# Altium schematic symbol library jlcpcb_2025_04_inductors_extended_0402.schlib: 1396 symbols (part 5 of 8) (continued)
## MLG1005SR27JT000
designator L?  Inductance: 270nH
Inductor, 270nH, ±5%, 3.54Ω, 100mA, SMD 0402; Manufacturer: TDK; Manufacturer Part Number: MLG1005SR27JT000; Self-Resonant Frequency: 500MHz; Q Factor: 8@100MHz; Package Size: 0402; JLCPCB Basic Part: No; JLCPCB Part Number: C76784; Supplier 1: LCSC; Category: Inductors; Supplier Part Number 1: C76784; Tolerance: ±5%; Rated Current: 100mA; DC Resistance: 3.54Ω; RoHS: Yes; ComponentLink1Description: Datasheet; ComponentLink1URL: https://wmsc.lcsc.com/wmsc/upload/file/pdf/v2/lcsc/2304140030_TDK-MLG1005SR27JT000_C76784.pdf; ComponentLink2Description: JLCPCB Part URL; ComponentLink2URL: https://jlcpcb.com/partdetail/C76784; ComponentLink3Description: LCSC Part URL; ComponentLink3URL: https://lcsc.com/product-detail/Inductors-SMD_TDK-TDK-MLG1005SR27JT000_C76784.html
footprint IND-0402 (0402 (1005M) Inductor)
pins: 1, 2

## MLG1005SR33JT000
designator L?  Inductance: 330nH
Inductor, 330nH, ±5%, 5.21Ω, 50mA, SMD 0402; Manufacturer: TDK; Manufacturer Part Number: MLG1005SR33JT000; Self-Resonant Frequency: 400MHz; Q Factor: 6@50MHz; Package Size: 0402; JLCPCB Basic Part: No; JLCPCB Part Number: C76785; Supplier 1: LCSC; Category: Inductors; Supplier Part Number 1: C76785; Tolerance: ±5%; Rated Current: 50mA; DC Resistance: 5.21Ω; RoHS: Yes; ComponentLink1Description: Datasheet; ComponentLink1URL: https://wmsc.lcsc.com/wmsc/upload/file/pdf/v2/lcsc/2304140030_TDK-MLG1005SR33JT000_C76785.pdf; ComponentLink2Description: JLCPCB Part URL; ComponentLink2URL: https://jlcpcb.com/partdetail/C76785; ComponentLink3Description: LCSC Part URL; ComponentLink3URL: https://lcsc.com/product-detail/Inductors-SMD_TDK-TDK-MLG1005SR33JT000_C76785.html
footprint IND-0402 (0402 (1005M) Inductor)
pins: 1, 2

## MLG1005SR39HT000
designator L?  Inductance: 390nH
Inductor, 390nH, ±3%, 5.97Ω, 50mA, SMD 0402; Manufacturer: TDK; Manufacturer Part Number: MLG1005SR39HT000; Self-Resonant Frequency: 400MHz; Q Factor: 6@50MHz; Package Size: 0402; JLCPCB Basic Part: No; JLCPCB Part Number: C360714; Supplier 1: LCSC; Category: Inductors; Supplier Part Number 1: C360714; Tolerance: ±3%; Rated Current: 50mA; DC Resistance: 5.97Ω; RoHS: Yes; ComponentLink1Description: Datasheet; ComponentLink1URL: https://wmsc.lcsc.com/wmsc/upload/file/pdf/v2/lcsc/1912111437_TDK-MLG1005SR39HT000_C360714.pdf; ComponentLink2Description: JLCPCB Part URL; ComponentLink2URL: https://jlcpcb.com/partdetail/C360714; ComponentLink3Description: LCSC Part URL; ComponentLink3URL: https://lcsc.com/product-detail/Inductors-SMD_TDK-TDK-MLG1005SR39HT000_C360714.html
footprint IND-0402 (0402 (1005M) Inductor)
pins: 1, 2

## MLG1005SR39JT000
designator L?  Inductance: 390nH
Inductor, 390nH, ±5%, 5.97Ω, 50mA, SMD 0402; Manufacturer: TDK; Manufacturer Part Number: MLG1005SR39JT000; Self-Resonant Frequency: 400MHz; Q Factor: 6@50MHz; Package Size: 0402; JLCPCB Basic Part: No; JLCPCB Part Number: C76786; Supplier 1: LCSC; Category: Inductors; Supplier Part Number 1: C76786; Tolerance: ±5%; Rated Current: 50mA; DC Resistance: 5.97Ω; RoHS: Yes; ComponentLink1Description: Datasheet; ComponentLink1URL: https://wmsc.lcsc.com/wmsc/upload/file/pdf/v2/lcsc/2304140030_TDK-MLG1005SR39JT000_C76786.pdf; ComponentLink2Description: JLCPCB Part URL; ComponentLink2URL: https://jlcpcb.com/partdetail/C76786; ComponentLink3Description: LCSC Part URL; ComponentLink3URL: https://lcsc.com/product-detail/Inductors-SMD_TDK-TDK-MLG1005SR39JT000_C76786.html
footprint IND-0402 (0402 (1005M) Inductor)
pins: 1, 2

## MLI1005F-R12KT
designator L?  Inductance: 0.12uH
Inductor, 0.12uH, ±10%, 0.8Ω, 25mA, SMD 0402; Manufacturer: Meled; Manufacturer Part Number: MLI1005F-R12KT; Self-Resonant Frequency: 165MHz; Q Factor: 10@25MHz; Package Size: 0402; JLCPCB Basic Part: No; JLCPCB Part Number: C2885830; Supplier 1: LCSC; Category: Inductors; Supplier Part Number 1: C2885830; Tolerance: ±10%; Rated Current: 25mA; DC Resistance: 0.8Ω; RoHS: Yes; ComponentLink1Description: Datasheet; ComponentLink1URL: https://wmsc.lcsc.com/wmsc/upload/file/pdf/v2/lcsc/2306021138_MetalLions-MLI1005F-R12KT_C2885830.pdf; ComponentLink2Description: JLCPCB Part URL; ComponentLink2URL: https://jlcpcb.com/partdetail/C2885830; ComponentLink3Description: LCSC Part URL; ComponentLink3URL: https://lcsc.com/product-detail/Inductors-SMD_MetalLions-MetalLions-MLI1005F-R12KT_C2885830.html
footprint IND-0402 (0402 (1005M) Inductor)
pins: 1, 2

## MLI1005F-R22KT
designator L?  Inductance: 0.22uH
Inductor, 0.22uH, ±10%, 1.2Ω, 25mA, SMD 0402; Manufacturer: Meled; Manufacturer Part Number: MLI1005F-R22KT; Self-Resonant Frequency: 110MHz; Q Factor: 10@25MHz; Package Size: 0402; JLCPCB Basic Part: No; JLCPCB Part Number: C2885833; Supplier 1: LCSC; Category: Inductors; Supplier Part Number 1: C2885833; Tolerance: ±10%; Rated Current: 25mA; DC Resistance: 1.2Ω; RoHS: Yes; ComponentLink1Description: Datasheet; ComponentLink1URL: https://wmsc.lcsc.com/wmsc/upload/file/pdf/v2/lcsc/2306021138_MetalLions-MLI1005F-R22KT_C2885833.pdf; ComponentLink2Description: JLCPCB Part URL; ComponentLink2URL: https://jlcpcb.com/partdetail/C2885833; ComponentLink3Description: LCSC Part URL; ComponentLink3URL: https://lcsc.com/product-detail/Inductors-SMD_MetalLions-MetalLions-MLI1005F-R22KT_C2885833.html
footprint IND-0402 (0402 (1005M) Inductor)
pins: 1, 2

## MLI1005F-R47KT
designator L?  Inductance: 470nH
Inductor, 470nH, ±10%, 0.7Ω, 15mA, SMD 0402; Manufacturer: Meled; Manufacturer Part Number: MLI1005F-R47KT; Self-Resonant Frequency: 80MHz; Q Factor: 20@10MHz; Package Size: 0402; JLCPCB Basic Part: No; JLCPCB Part Number: C2885835; Supplier 1: LCSC; Category: Inductors; Supplier Part Number 1: C2885835; Tolerance: ±10%; Rated Current: 15mA; DC Resistance: 0.7Ω; RoHS: Yes; ComponentLink1Description: Datasheet; ComponentLink1URL: https://wmsc.lcsc.com/wmsc/upload/file/pdf/v2/lcsc/2306021138_MetalLions-MLI1005F-R47KT_C2885835.pdf; ComponentLink2Description: JLCPCB Part URL; ComponentLink2URL: https://jlcpcb.com/partdetail/C2885835; ComponentLink3Description: LCSC Part URL; ComponentLink3URL: https://lcsc.com/product-detail/Inductors-SMD_MetalLions-MetalLions-MLI1005F-R47KT_C2885835.html
footprint IND-0402 (0402 (1005M) Inductor)
pins: 1, 2

## MLJ1005WR10JT000
designator L?  Inductance: 100nH
Inductor, 100nH, ±5%, 300mΩ, 500mA, SMD 0402; Manufacturer: TDK; Manufacturer Part Number: MLJ1005WR10JT000; Self-Resonant Frequency: 550MHz; Q Factor: 15@25MHz; Package Size: 0402; JLCPCB Basic Part: No; JLCPCB Part Number: C380011; Supplier 1: LCSC; Category: Inductors; Supplier Part Number 1: C380011; Tolerance: ±5%; Rated Current: 500mA; Saturation Current: 500mA; DC Resistance: 300mΩ; RoHS: Yes; ComponentLink1Description: Datasheet; ComponentLink1URL: https://wmsc.lcsc.com/wmsc/upload/file/pdf/v2/lcsc/2304140030_TDK-MLJ1005WR10JT000_C380011.pdf; ComponentLink2Description: JLCPCB Part URL; ComponentLink2URL: https://jlcpcb.com/partdetail/C380011; ComponentLink3Description: LCSC Part URL; ComponentLink3URL: https://lcsc.com/product-detail/Inductors-SMD_TDK-TDK-MLJ1005WR10JT000_C380011.html
footprint IND-0402 (0402 (1005M) Inductor)
pins: 1, 2

## MLJ1005WR16JT000
designator L?  Inductance: 160nH
Inductor, 160nH, ±5%, 520mΩ, 400mA, SMD 0402; Manufacturer: TDK; Manufacturer Part Number: MLJ1005WR16JT000; Saturation Current: 450mA; Self-Resonant Frequency: 600MHz; Q Factor: 15@25MHz; Package Size: 0402; JLCPCB Basic Part: No; JLCPCB Part Number: C413908; Supplier 1: LCSC; Category: Inductors; Supplier Part Number 1: C413908; Tolerance: ±5%; Rated Current: 400mA; DC Resistance: 520mΩ; RoHS: Yes; ComponentLink1Description: Datasheet; ComponentLink1URL: https://wmsc.lcsc.com/wmsc/upload/file/pdf/v2/lcsc/1912111437_TDK-MLJ1005WR16JT000_C413908.pdf; ComponentLink2Description: JLCPCB Part URL; ComponentLink2URL: https://jlcpcb.com/partdetail/C413908; ComponentLink3Description: LCSC Part URL; ComponentLink3URL: https://lcsc.com/product-detail/Inductors-SMD_TDK-TDK-MLJ1005WR16JT000_C413908.html
footprint IND-0402 (0402 (1005M) Inductor)
pins: 1, 2

## MLK1005S1N2ST000
designator L?  Inductance: 1.2nH
Inductor, 1.2nH, 50mΩ, 500mA, SMD 0402; Manufacturer: TDK; Manufacturer Part Number: MLK1005S1N2ST000; Self-Resonant Frequency: 11GHz; Q Factor: 5@100MHz; Package Size: 0402; JLCPCB Basic Part: No; JLCPCB Part Number: C275321; Supplier 1: LCSC; Category: Inductors; Supplier Part Number 1: C275321; Rated Current: 500mA; DC Resistance: 50mΩ; RoHS: Yes; ComponentLink1Description: Datasheet; ComponentLink1URL: https://wmsc.lcsc.com/wmsc/upload/file/pdf/v2/lcsc/2304140030_TDK-MLK1005S1N2ST000_C275321.pdf; ComponentLink2Description: JLCPCB Part URL; ComponentLink2URL: https://jlcpcb.com/partdetail/C275321; ComponentLink3Description: LCSC Part URL; ComponentLink3URL: https://lcsc.com/product-detail/Inductors-SMD_TDK-TDK-MLK1005S1N2ST000_C275321.html
footprint IND-0402 (0402 (1005M) Inductor)
pins: 1, 2

## MLK1005S1N5ST000
designator L?  Inductance: 1.5nH
Inductor, 1.5nH, 60mΩ, 500mA, SMD 0402; Manufacturer: TDK; Manufacturer Part Number: MLK1005S1N5ST000; Self-Resonant Frequency: 9.5GHz; Q Factor: 6@100MHz; Package Size: 0402; JLCPCB Basic Part: No; JLCPCB Part Number: C114769; Supplier 1: LCSC; Category: Inductors; Supplier Part Number 1: C114769; Rated Current: 500mA; DC Resistance: 60mΩ; RoHS: Yes; ComponentLink1Description: Datasheet; ComponentLink1URL: https://wmsc.lcsc.com/wmsc/upload/file/pdf/v2/lcsc/2304140030_TDK-MLK1005S1N5ST000_C114769.pdf; ComponentLink2Description: JLCPCB Part URL; ComponentLink2URL: https://jlcpcb.com/partdetail/C114769; ComponentLink3Description: LCSC Part URL; ComponentLink3URL: https://lcsc.com/product-detail/Inductors-SMD_TDK-TDK-MLK1005S1N5ST000_C114769.html
footprint IND-0402 (0402 (1005M) Inductor)
pins: 1, 2

## MLK1005S1N8ST000
designator L?  Inductance: 1.8nH
Inductor, 1.8nH, 70mΩ, 500mA, SMD 0402; Manufacturer: TDK; Manufacturer Part Number: MLK1005S1N8ST000; Self-Resonant Frequency: 8.5GHz; Q Factor: 6@100MHz; Package Size: 0402; JLCPCB Basic Part: No; JLCPCB Part Number: C76789; Supplier 1: LCSC; Category: Inductors; Supplier Part Number 1: C76789; Rated Current: 500mA; DC Resistance: 70mΩ; RoHS: Yes; ComponentLink1Description: Datasheet; ComponentLink1URL: https://wmsc.lcsc.com/wmsc/upload/file/pdf/v2/lcsc/2304140030_TDK-MLK1005S1N8ST000_C76789.pdf; ComponentLink2Description: JLCPCB Part URL; ComponentLink2URL: https://jlcpcb.com/partdetail/C76789; ComponentLink3Description: LCSC Part URL; ComponentLink3URL: https://lcsc.com/product-detail/Inductors-SMD_TDK-TDK-MLK1005S1N8ST000_C76789.html
footprint IND-0402 (0402 (1005M) Inductor)
pins: 1, 2

## MLK1005S2N2ST000
designator L?  Inductance: 2.2nH
Inductor, 2.2nH, 80mΩ, 500mA, SMD 0402; Manufacturer: TDK; Manufacturer Part Number: MLK1005S2N2ST000; Self-Resonant Frequency: 8GHz; Q Factor: 6@100MHz; Package Size: 0402; JLCPCB Basic Part: No; JLCPCB Part Number: C76790; Supplier 1: LCSC; Category: Inductors; Supplier Part Number 1: C76790; Rated Current: 500mA; DC Resistance: 80mΩ; RoHS: Yes; ComponentLink1Description: Datasheet; ComponentLink1URL: https://wmsc.lcsc.com/wmsc/upload/file/pdf/v2/lcsc/1809051312_TDK-MLK1005S2N2ST000_C76790.pdf; ComponentLink2Description: JLCPCB Part URL; ComponentLink2URL: https://jlcpcb.com/partdetail/C76790; ComponentLink3Description: LCSC Part URL; ComponentLink3URL: https://lcsc.com/product-detail/Inductors-SMD_TDK-TDK-MLK1005S2N2ST000_C76790.html
footprint IND-0402 (0402 (1005M) Inductor)
pins: 1, 2

## MLK1005S2N7ST000
designator L?  Inductance: 2.7nH
Inductor, 2.7nH, 100mΩ, 500mA, SMD 0402; Manufacturer: TDK; Manufacturer Part Number: MLK1005S2N7ST000; Self-Resonant Frequency: 7.5GHz; Q Factor: 6@100MHz; Package Size: 0402; JLCPCB Basic Part: No; JLCPCB Part Number: C76791; Supplier 1: LCSC; Category: Inductors; Supplier Part Number 1: C76791; Rated Current: 500mA; DC Resistance: 100mΩ; RoHS: Yes; ComponentLink1Description: Datasheet; ComponentLink1URL: https://wmsc.lcsc.com/wmsc/upload/file/pdf/v2/lcsc/2304140030_TDK-MLK1005S2N7ST000_C76791.pdf; ComponentLink2Description: JLCPCB Part URL; ComponentLink2URL: https://jlcpcb.com/partdetail/C76791; ComponentLink3Description: LCSC Part URL; ComponentLink3URL: https://lcsc.com/product-detail/Inductors-SMD_TDK-TDK-MLK1005S2N7ST000_C76791.html
footprint IND-0402 (0402 (1005M) Inductor)
pins: 1, 2

## MLK1005S3N3ST000
designator L?  Inductance: 3.3nH
Inductor, 3.3nH, 110mΩ, 400mA, SMD 0402; Manufacturer: TDK; Manufacturer Part Number: MLK1005S3N3ST000; Self-Resonant Frequency: 8.3GHz; Q Factor: 7@100MHz; Package Size: 0402; JLCPCB Basic Part: No; JLCPCB Part Number: C107321; Supplier 1: LCSC; Category: Inductors; Supplier Part Number 1: C107321; Rated Current: 400mA; DC Resistance: 110mΩ; RoHS: Yes; ComponentLink1Description: Datasheet; ComponentLink1URL: https://wmsc.lcsc.com/wmsc/upload/file/pdf/v2/lcsc/1810162216_TDK-MLK1005S3N3ST000_C107321.pdf; ComponentLink2Description: JLCPCB Part URL; ComponentLink2URL: https://jlcpcb.com/partdetail/C107321; ComponentLink3Description: LCSC Part URL; ComponentLink3URL: https://lcsc.com/product-detail/Inductors-SMD_TDK-TDK-MLK1005S3N3ST000_C107321.html
footprint IND-0402 (0402 (1005M) Inductor)
pins: 1, 2

## MLK1005S3N9ST000
designator L?  Inductance: 3.9nH
Inductor, 3.9nH, 120mΩ, 400mA, SMD 0402; Manufacturer: TDK; Manufacturer Part Number: MLK1005S3N9ST000; Self-Resonant Frequency: 7.8GHz; Q Factor: 7@100MHz; Package Size: 0402; JLCPCB Basic Part: No; JLCPCB Part Number: C76792; Supplier 1: LCSC; Category: Inductors; Supplier Part Number 1: C76792; Rated Current: 400mA; DC Resistance: 120mΩ; RoHS: Yes; ComponentLink1Description: Datasheet; ComponentLink1URL: https://wmsc.lcsc.com/wmsc/upload/file/pdf/v2/lcsc/2304140030_TDK-MLK1005S3N9ST000_C76792.pdf; ComponentLink2Description: JLCPCB Part URL; ComponentLink2URL: https://jlcpcb.com/partdetail/C76792; ComponentLink3Description: LCSC Part URL; ComponentLink3URL: https://lcsc.com/product-detail/Inductors-SMD_TDK-TDK-MLK1005S3N9ST000_C76792.html
footprint IND-0402 (0402 (1005M) Inductor)
pins: 1, 2

## MLK1005S3N9STD25
designator L?  Inductance: 3.9nH
Inductor, 3.9nH, 250mΩ, 400mA, SMD 0402; Manufacturer: TDK; Manufacturer Part Number: MLK1005S3N9STD25; Q Factor: 7@100MHz; Package Size: 0402; JLCPCB Basic Part: No; JLCPCB Part Number: C524461; Supplier 1: LCSC; Category: Inductors; Supplier Part Number 1: C524461; Rated Current: 400mA; DC Resistance: 250mΩ; RoHS: Yes; ComponentLink1Description: Datasheet; ComponentLink1URL: https://wmsc.lcsc.com/wmsc/upload/file/pdf/v2/lcsc/2304140030_TDK-MLK1005S3N9STD25_C524461.pdf; ComponentLink2Description: JLCPCB Part URL; ComponentLink2URL: https://jlcpcb.com/partdetail/C524461; ComponentLink3Description: LCSC Part URL; ComponentLink3URL: https://lcsc.com/product-detail/Inductors-SMD_TDK-TDK-MLK1005S3N9STD25_C524461.html
footprint IND-0402 (0402 (1005M) Inductor)
pins: 1, 2

## MLK1005S4N3ST000
designator L?  Inductance: 4.3nH
Inductor, 4.3nH, 130mΩ, 400mA, SMD 0402; Manufacturer: TDK; Manufacturer Part Number: MLK1005S4N3ST000; Self-Resonant Frequency: 7.4GHz; Q Factor: 7@100MHz; Package Size: 0402; JLCPCB Basic Part: No; JLCPCB Part Number: C275326; Supplier 1: LCSC; Category: Inductors; Supplier Part Number 1: C275326; Rated Current: 400mA; DC Resistance: 130mΩ; RoHS: Yes; ComponentLink1Description: Datasheet; ComponentLink1URL: https://wmsc.lcsc.com/wmsc/upload/file/pdf/v2/lcsc/2304140030_TDK-MLK1005S4N3ST000_C275326.pdf; ComponentLink2Description: JLCPCB Part URL; ComponentLink2URL: https://jlcpcb.com/partdetail/C275326; ComponentLink3Description: LCSC Part URL; ComponentLink3URL: https://lcsc.com/product-detail/Inductors-SMD_TDK-TDK-MLK1005S4N3ST000_C275326.html
footprint IND-0402 (0402 (1005M) Inductor)
pins: 1, 2

## MLK1005S4N7ST000
designator L?  Inductance: 4.7nH
Inductor, 4.7nH, 130mΩ, 400mA, SMD 0402; Manufacturer: TDK; Manufacturer Part Number: MLK1005S4N7ST000; Self-Resonant Frequency: 6GHz; Q Factor: 7@100MHz; Package Size: 0402; JLCPCB Basic Part: No; JLCPCB Part Number: C136252; Supplier 1: LCSC; Category: Inductors; Supplier Part Number 1: C136252; Rated Current: 400mA; DC Resistance: 130mΩ; RoHS: Yes; ComponentLink1Description: Datasheet; ComponentLink1URL: https://wmsc.lcsc.com/wmsc/upload/file/pdf/v2/lcsc/2304140030_TDK-MLK1005S4N7ST000_C136252.pdf; ComponentLink2Description: JLCPCB Part URL; ComponentLink2URL: https://jlcpcb.com/partdetail/C136252; ComponentLink3Description: LCSC Part URL; ComponentLink3URL: https://lcsc.com/product-detail/Inductors-SMD_TDK-TDK-MLK1005S4N7ST000_C136252.html
footprint IND-0402 (0402 (1005M) Inductor)
pins: 1, 2

## MLK1005S5N6DT000
designator L?  Inductance: 5.6nH
Inductor, 5.6nH, 150mΩ, 400mA, SMD 0402; Manufacturer: TDK; Manufacturer Part Number: MLK1005S5N6DT000; Package Size: 0402; JLCPCB Basic Part: No; JLCPCB Part Number: C275328; Supplier 1: LCSC; Category: Inductors; Supplier Part Number 1: C275328; Rated Current: 400mA; DC Resistance: 150mΩ; RoHS: Yes; ComponentLink1Description: Datasheet; ComponentLink1URL: https://wmsc.lcsc.com/wmsc/upload/file/pdf/v2/lcsc/2007151106_TDK-MLK1005S5N6DT000_C275328.pdf; ComponentLink2Description: JLCPCB Part URL; ComponentLink2URL: https://jlcpcb.com/partdetail/C275328; ComponentLink3Description: LCSC Part URL; ComponentLink3URL: https://lcsc.com/product-detail/Inductors-SMD_TDK-TDK-MLK1005S5N6DT000_C275328.html
footprint IND-0402 (0402 (1005M) Inductor)
pins: 1, 2

## MLK1005S6N8DT000
designator L?  Inductance: 6.8nH
Inductor, 6.8nH, 350mΩ, 400mA, SMD 0402; Manufacturer: TDK; Manufacturer Part Number: MLK1005S6N8DT000; Self-Resonant Frequency: 100MHz; Q Factor: 7@100MHz; Package Size: 0402; JLCPCB Basic Part: No; JLCPCB Part Number: C275330; Supplier 1: LCSC; Category: Inductors; Supplier Part Number 1: C275330; Rated Current: 400mA; DC Resistance: 350mΩ; RoHS: Yes; ComponentLink1Description: Datasheet; ComponentLink1URL: https://wmsc.lcsc.com/wmsc/upload/file/pdf/v2/lcsc/2304140030_TDK-MLK1005S6N8DT000_C275330.pdf; ComponentLink2Description: JLCPCB Part URL; ComponentLink2URL: https://jlcpcb.com/partdetail/C275330; ComponentLink3Description: LCSC Part URL; ComponentLink3URL: https://lcsc.com/product-detail/Inductors-SMD_TDK-TDK-MLK1005S6N8DT000_C275330.html
footprint IND-0402 (0402 (1005M) Inductor)
pins: 1, 2

## MLK1005S8N2DT000
designator L?  Inductance: 8.2nH
Inductor, 8.2nH, SMD 0402; Manufacturer: TDK; Manufacturer Part Number: MLK1005S8N2DT000; Package Size: 0402; JLCPCB Basic Part: No; JLCPCB Part Number: C87541; Supplier 1: LCSC; Category: Inductors; Supplier Part Number 1: C87541; RoHS: Yes; ComponentLink1Description: Datasheet; ComponentLink1URL: https://wmsc.lcsc.com/wmsc/upload/file/pdf/v2/lcsc/2304140030_TDK-MLK1005S8N2DT000_C87541.pdf; ComponentLink2Description: JLCPCB Part URL; ComponentLink2URL: https://jlcpcb.com/partdetail/C87541; ComponentLink3Description: LCSC Part URL; ComponentLink3URL: https://lcsc.com/product-detail/Inductors-SMD_TDK-TDK-MLK1005S8N2DT000_C87541.html
footprint IND-0402 (0402 (1005M) Inductor)
pins: 1, 2

## MLK1005S8N2JT000
designator L?  Inductance: 8.2nH
Inductor, 8.2nH, ±5%, 210mΩ, 350mA, SMD 0402; Manufacturer: TDK; Manufacturer Part Number: MLK1005S8N2JT000; Self-Resonant Frequency: 5GHz; Q Factor: 7@100MHz; Package Size: 0402; JLCPCB Basic Part: No; JLCPCB Part Number: C87542; Supplier 1: LCSC; Category: Inductors; Supplier Part Number 1: C87542; Tolerance: ±5%; Rated Current: 350mA; DC Resistance: 210mΩ; RoHS: Yes; ComponentLink1Description: Datasheet; ComponentLink1URL: https://wmsc.lcsc.com/wmsc/upload/file/pdf/v2/lcsc/2304140030_TDK-MLK1005S8N2JT000_C87542.pdf; ComponentLink2Description: JLCPCB Part URL; ComponentLink2URL: https://jlcpcb.com/partdetail/C87542; ComponentLink3Description: LCSC Part URL; ComponentLink3URL: https://lcsc.com/product-detail/Inductors-SMD_TDK-TDK-MLK1005S8N2JT000_C87542.html
footprint IND-0402 (0402 (1005M) Inductor)
pins: 1, 2

## MLK1005S10NJT000
designator L?  Inductance: 10nH
Inductor, 10nH, ±5%, 230mΩ, 350mA, SMD 0402; Manufacturer: TDK; Manufacturer Part Number: MLK1005S10NJT000; Self-Resonant Frequency: 5.2GHz; Q Factor: 7@100MHz; Package Size: 0402; JLCPCB Basic Part: No; JLCPCB Part Number: C275317; Supplier 1: LCSC; Category: Inductors; Supplier Part Number 1: C275317; Tolerance: ±5%; Rated Current: 350mA; DC Resistance: 230mΩ; RoHS: Yes; ComponentLink1Description: Datasheet; ComponentLink1URL: https://wmsc.lcsc.com/wmsc/upload/file/pdf/v2/lcsc/2304140030_TDK-MLK1005S10NJT000_C275317.pdf; ComponentLink2Description: JLCPCB Part URL; ComponentLink2URL: https://jlcpcb.com/partdetail/C275317; ComponentLink3Description: LCSC Part URL; ComponentLink3URL: https://lcsc.com/product-detail/Inductors-SMD_TDK-TDK-MLK1005S10NJT000_C275317.html
footprint IND-0402 (0402 (1005M) Inductor)
pins: 1, 2

## MLK1005S12NHT000
designator L?  Inductance: 12nH
Inductor, 12nH, ±3%, SMD 0402; Manufacturer: TDK; Manufacturer Part Number: MLK1005S12NHT000; Package Size: 0402; JLCPCB Basic Part: No; JLCPCB Part Number: C275318; Supplier 1: LCSC; Category: Inductors; Supplier Part Number 1: C275318; Tolerance: ±3%; RoHS: Yes; ComponentLink1Description: Datasheet; ComponentLink1URL: https://wmsc.lcsc.com/wmsc/upload/file/pdf/v2/lcsc/2304140030_TDK-MLK1005S12NHT000_C275318.pdf; ComponentLink2Description: JLCPCB Part URL; ComponentLink2URL: https://jlcpcb.com/partdetail/C275318; ComponentLink3Description: LCSC Part URL; ComponentLink3URL: https://lcsc.com/product-detail/Inductors-SMD_TDK-TDK-MLK1005S12NHT000_C275318.html
footprint IND-0402 (0402 (1005M) Inductor)
pins: 1, 2

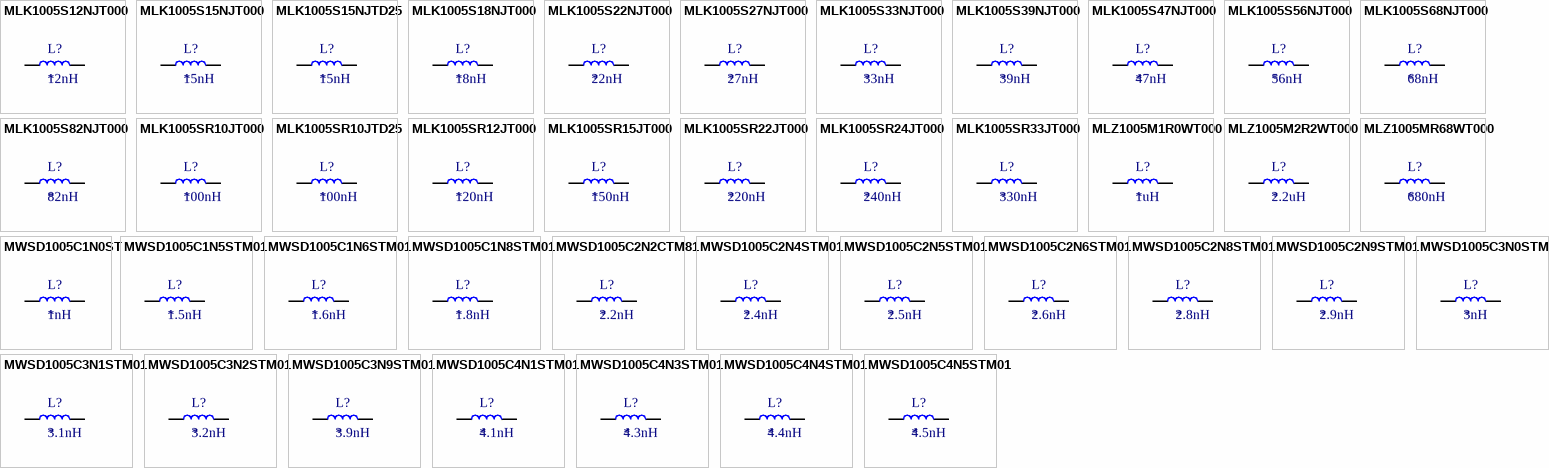
[diagram p23: symbols MLK1005S12NJT000 to MWSD1005C4N5STM01]

## MLK1005S12NJT000
designator L?  Inductance: 12nH
Inductor, 12nH, ±5%, 270mΩ, 350mA, SMD 0402; Manufacturer: TDK; Manufacturer Part Number: MLK1005S12NJT000; Self-Resonant Frequency: 4.3GHz; Q Factor: 7@100MHz; Package Size: 0402; JLCPCB Basic Part: No; JLCPCB Part Number: C275319; Supplier 1: LCSC; Category: Inductors; Supplier Part Number 1: C275319; Tolerance: ±5%; Rated Current: 350mA; DC Resistance: 270mΩ; RoHS: Yes; ComponentLink1Description: Datasheet; ComponentLink1URL: https://wmsc.lcsc.com/wmsc/upload/file/pdf/v2/lcsc/2304140030_TDK-MLK1005S12NJT000_C275319.pdf; ComponentLink2Description: JLCPCB Part URL; ComponentLink2URL: https://jlcpcb.com/partdetail/C275319; ComponentLink3Description: LCSC Part URL; ComponentLink3URL: https://lcsc.com/product-detail/Inductors-SMD_TDK-TDK-MLK1005S12NJT000_C275319.html
footprint IND-0402 (0402 (1005M) Inductor)
pins: 1, 2

## MLK1005S15NJT000
designator L?  Inductance: 15nH
Inductor, 15nH, ±5%, 330mΩ, 300mA, SMD 0402; Manufacturer: TDK; Manufacturer Part Number: MLK1005S15NJT000; Self-Resonant Frequency: 4GHz; Q Factor: 7@100MHz; Package Size: 0402; JLCPCB Basic Part: No; JLCPCB Part Number: C76787; Supplier 1: LCSC; Category: Inductors; Supplier Part Number 1: C76787; Tolerance: ±5%; Rated Current: 300mA; DC Resistance: 330mΩ; RoHS: Yes; ComponentLink1Description: Datasheet; ComponentLink1URL: https://wmsc.lcsc.com/wmsc/upload/file/pdf/v2/lcsc/2304140030_TDK-MLK1005S15NJT000_C76787.pdf; ComponentLink2Description: JLCPCB Part URL; ComponentLink2URL: https://jlcpcb.com/partdetail/C76787; ComponentLink3Description: LCSC Part URL; ComponentLink3URL: https://lcsc.com/product-detail/Inductors-SMD_TDK-TDK-MLK1005S15NJT000_C76787.html
footprint IND-0402 (0402 (1005M) Inductor)
pins: 1, 2

## MLK1005S15NJTD25
designator L?  Inductance: 15nH
Inductor, 15nH, ±5%, 500mΩ, 300mA, SMD 0402; Manufacturer: TDK; Manufacturer Part Number: MLK1005S15NJTD25; Self-Resonant Frequency: 4GHz; Q Factor: 7@100MHz; Package Size: 0402; JLCPCB Basic Part: No; JLCPCB Part Number: C502008; Supplier 1: LCSC; Category: Inductors; Supplier Part Number 1: C502008; Tolerance: ±5%; Rated Current: 300mA; DC Resistance: 500mΩ; RoHS: Yes; ComponentLink1Description: Datasheet; ComponentLink1URL: https://wmsc.lcsc.com/wmsc/upload/file/pdf/v2/lcsc/2304140030_TDK-MLK1005S15NJTD25_C502008.pdf; ComponentLink2Description: JLCPCB Part URL; ComponentLink2URL: https://jlcpcb.com/partdetail/C502008; ComponentLink3Description: LCSC Part URL; ComponentLink3URL: https://lcsc.com/product-detail/Inductors-SMD_TDK-TDK-MLK1005S15NJTD25_C502008.html
footprint IND-0402 (0402 (1005M) Inductor)
pins: 1, 2

## MLK1005S18NJT000
designator L?  Inductance: 18nH
Inductor, 18nH, ±5%, 380mΩ, 250mA, SMD 0402; Manufacturer: TDK; Manufacturer Part Number: MLK1005S18NJT000; Self-Resonant Frequency: 4GHz; Q Factor: 7@100MHz; Package Size: 0402; JLCPCB Basic Part: No; JLCPCB Part Number: C89444; Supplier 1: LCSC; Category: Inductors; Supplier Part Number 1: C89444; Tolerance: ±5%; Rated Current: 250mA; DC Resistance: 380mΩ; RoHS: Yes; ComponentLink1Description: Datasheet; ComponentLink1URL: https://wmsc.lcsc.com/wmsc/upload/file/pdf/v2/lcsc/2304140030_TDK-MLK1005S18NJT000_C89444.pdf; ComponentLink2Description: JLCPCB Part URL; ComponentLink2URL: https://jlcpcb.com/partdetail/C89444; ComponentLink3Description: LCSC Part URL; ComponentLink3URL: https://lcsc.com/product-detail/Inductors-SMD_TDK-TDK-MLK1005S18NJT000_C89444.html
footprint IND-0402 (0402 (1005M) Inductor)
pins: 1, 2

## MLK1005S22NJT000
designator L?  Inductance: 22nH
Inductor, 22nH, ±5%, 460mΩ, 200mA, SMD 0402; Manufacturer: TDK; Manufacturer Part Number: MLK1005S22NJT000; Self-Resonant Frequency: 4.4GHz; Q Factor: 7@100MHz; Package Size: 0402; JLCPCB Basic Part: No; JLCPCB Part Number: C107320; Supplier 1: LCSC; Category: Inductors; Supplier Part Number 1: C107320; Tolerance: ±5%; Rated Current: 200mA; DC Resistance: 460mΩ; RoHS: Yes; ComponentLink1Description: Datasheet; ComponentLink1URL: https://wmsc.lcsc.com/wmsc/upload/file/pdf/v2/lcsc/2304140030_TDK-MLK1005S22NJT000_C107320.pdf; ComponentLink2Description: JLCPCB Part URL; ComponentLink2URL: https://jlcpcb.com/partdetail/C107320; ComponentLink3Description: LCSC Part URL; ComponentLink3URL: https://lcsc.com/product-detail/Inductors-SMD_TDK-TDK-MLK1005S22NJT000_C107320.html
footprint IND-0402 (0402 (1005M) Inductor)
pins: 1, 2

## MLK1005S27NJT000
designator L?  Inductance: 27nH
Inductor, 27nH, ±5%, 530mΩ, 200mA, SMD 0402; Manufacturer: TDK; Manufacturer Part Number: MLK1005S27NJT000; Self-Resonant Frequency: 3GHz; Q Factor: 7@100MHz; Package Size: 0402; JLCPCB Basic Part: No; JLCPCB Part Number: C114782; Supplier 1: LCSC; Category: Inductors; Supplier Part Number 1: C114782; Tolerance: ±5%; Rated Current: 200mA; DC Resistance: 530mΩ; RoHS: Yes; ComponentLink1Description: Datasheet; ComponentLink1URL: https://wmsc.lcsc.com/wmsc/upload/file/pdf/v2/lcsc/2304140030_TDK-MLK1005S27NJT000_C114782.pdf; ComponentLink2Description: JLCPCB Part URL; ComponentLink2URL: https://jlcpcb.com/partdetail/C114782; ComponentLink3Description: LCSC Part URL; ComponentLink3URL: https://lcsc.com/product-detail/Inductors-SMD_TDK-TDK-MLK1005S27NJT000_C114782.html
footprint IND-0402 (0402 (1005M) Inductor)
pins: 1, 2

## MLK1005S33NJT000
designator L?  Inductance: 33nH
Inductor, 33nH, ±5%, 590mΩ, 200mA, SMD 0402; Manufacturer: TDK; Manufacturer Part Number: MLK1005S33NJT000; Self-Resonant Frequency: 3.5GHz; Q Factor: 7@100MHz; Package Size: 0402; JLCPCB Basic Part: No; JLCPCB Part Number: C275323; Supplier 1: LCSC; Category: Inductors; Supplier Part Number 1: C275323; Tolerance: ±5%; Rated Current: 200mA; DC Resistance: 590mΩ; RoHS: Yes; ComponentLink1Description: Datasheet; ComponentLink1URL: https://wmsc.lcsc.com/wmsc/upload/file/pdf/v2/lcsc/2304140030_TDK-MLK1005S33NJT000_C275323.pdf; ComponentLink2Description: JLCPCB Part URL; ComponentLink2URL: https://jlcpcb.com/partdetail/C275323; ComponentLink3Description: LCSC Part URL; ComponentLink3URL: https://lcsc.com/product-detail/Inductors-SMD_TDK-TDK-MLK1005S33NJT000_C275323.html
footprint IND-0402 (0402 (1005M) Inductor)
pins: 1, 2

## MLK1005S39NJT000
designator L?  Inductance: 39nH
Inductor, 39nH, ±5%, 650mΩ, 200mA, SMD 0402; Manufacturer: TDK; Manufacturer Part Number: MLK1005S39NJT000; Self-Resonant Frequency: 2GHz; Q Factor: 6@100MHz; Package Size: 0402; JLCPCB Basic Part: No; JLCPCB Part Number: C275324; Supplier 1: LCSC; Category: Inductors; Supplier Part Number 1: C275324; Tolerance: ±5%; Rated Current: 200mA; DC Resistance: 650mΩ; RoHS: Yes; ComponentLink1Description: Datasheet; ComponentLink1URL: https://wmsc.lcsc.com/wmsc/upload/file/pdf/v2/lcsc/2304140030_TDK-MLK1005S39NJT000_C275324.pdf; ComponentLink2Description: JLCPCB Part URL; ComponentLink2URL: https://jlcpcb.com/partdetail/C275324; ComponentLink3Description: LCSC Part URL; ComponentLink3URL: https://lcsc.com/product-detail/Inductors-SMD_TDK-TDK-MLK1005S39NJT000_C275324.html
footprint IND-0402 (0402 (1005M) Inductor)
pins: 1, 2

## MLK1005S47NJT000
designator L?  Inductance: 47nH
Inductor, 47nH, ±5%, 740mΩ, 200mA, SMD 0402; Manufacturer: TDK; Manufacturer Part Number: MLK1005S47NJT000; Self-Resonant Frequency: 1.8GHz; Q Factor: 6@100MHz; Package Size: 0402; JLCPCB Basic Part: No; JLCPCB Part Number: C275325; Supplier 1: LCSC; Category: Inductors; Supplier Part Number 1: C275325; Tolerance: ±5%; Rated Current: 200mA; DC Resistance: 740mΩ; RoHS: Yes; ComponentLink1Description: Datasheet; ComponentLink1URL: https://wmsc.lcsc.com/wmsc/upload/file/pdf/v2/lcsc/2304140030_TDK-MLK1005S47NJT000_C275325.pdf; ComponentLink2Description: JLCPCB Part URL; ComponentLink2URL: https://jlcpcb.com/partdetail/C275325; ComponentLink3Description: LCSC Part URL; ComponentLink3URL: https://lcsc.com/product-detail/Inductors-SMD_TDK-TDK-MLK1005S47NJT000_C275325.html
footprint IND-0402 (0402 (1005M) Inductor)
pins: 1, 2

## MLK1005S56NJT000
designator L?  Inductance: 56nH
Inductor, 56nH, ±5%, 840mΩ, 200mA, SMD 0402; Manufacturer: TDK; Manufacturer Part Number: MLK1005S56NJT000; Self-Resonant Frequency: 1.5GHz; Q Factor: 6@100MHz; Package Size: 0402; JLCPCB Basic Part: No; JLCPCB Part Number: C275327; Supplier 1: LCSC; Category: Inductors; Supplier Part Number 1: C275327; Tolerance: ±5%; Rated Current: 200mA; DC Resistance: 840mΩ; RoHS: Yes; ComponentLink1Description: Datasheet; ComponentLink1URL: https://wmsc.lcsc.com/wmsc/upload/file/pdf/v2/lcsc/2304140030_TDK-MLK1005S56NJT000_C275327.pdf; ComponentLink2Description: JLCPCB Part URL; ComponentLink2URL: https://jlcpcb.com/partdetail/C275327; ComponentLink3Description: LCSC Part URL; ComponentLink3URL: https://lcsc.com/product-detail/Inductors-SMD_TDK-TDK-MLK1005S56NJT000_C275327.html
footprint IND-0402 (0402 (1005M) Inductor)
pins: 1, 2

## MLK1005S68NJT000
designator L?  Inductance: 68nH
Inductor, 68nH, ±5%, 1.01Ω, 150mA, SMD 0402; Manufacturer: TDK; Manufacturer Part Number: MLK1005S68NJT000; Self-Resonant Frequency: 2.4GHz; Q Factor: 6@100MHz; Package Size: 0402; JLCPCB Basic Part: No; JLCPCB Part Number: C275329; Supplier 1: LCSC; Category: Inductors; Supplier Part Number 1: C275329; Tolerance: ±5%; Rated Current: 150mA; DC Resistance: 1.01Ω; RoHS: Yes; ComponentLink1Description: Datasheet; ComponentLink1URL: https://wmsc.lcsc.com/wmsc/upload/file/pdf/v2/lcsc/2304140030_TDK-MLK1005S68NJT000_C275329.pdf; ComponentLink2Description: JLCPCB Part URL; ComponentLink2URL: https://jlcpcb.com/partdetail/C275329; ComponentLink3Description: LCSC Part URL; ComponentLink3URL: https://lcsc.com/product-detail/Inductors-SMD_TDK-TDK-MLK1005S68NJT000_C275329.html
footprint IND-0402 (0402 (1005M) Inductor)
pins: 1, 2

## MLK1005S82NJT000
designator L?  Inductance: 82nH
Inductor, 82nH, ±5%, 1.39Ω, 150mA, SMD 0402; Manufacturer: TDK; Manufacturer Part Number: MLK1005S82NJT000; Self-Resonant Frequency: 1.3GHz; Q Factor: 6@100MHz; Package Size: 0402; JLCPCB Basic Part: No; JLCPCB Part Number: C275332; Supplier 1: LCSC; Category: Inductors; Supplier Part Number 1: C275332; Tolerance: ±5%; Rated Current: 150mA; DC Resistance: 1.39Ω; RoHS: Yes; ComponentLink1Description: Datasheet; ComponentLink1URL: https://wmsc.lcsc.com/wmsc/upload/file/pdf/v2/lcsc/2304140030_TDK-MLK1005S82NJT000_C275332.pdf; ComponentLink2Description: JLCPCB Part URL; ComponentLink2URL: https://jlcpcb.com/partdetail/C275332; ComponentLink3Description: LCSC Part URL; ComponentLink3URL: https://lcsc.com/product-detail/Inductors-SMD_TDK-TDK-MLK1005S82NJT000_C275332.html
footprint IND-0402 (0402 (1005M) Inductor)
pins: 1, 2

## MLK1005SR10JT000
designator L?  Inductance: 100nH
Inductor, 100nH, ±5%, 1.6Ω, 100mA, SMD 0402; Manufacturer: TDK; Manufacturer Part Number: MLK1005SR10JT000; Self-Resonant Frequency: 1.9GHz; Q Factor: 6@100MHz; Package Size: 0402; JLCPCB Basic Part: No; JLCPCB Part Number: C275333; Supplier 1: LCSC; Category: Inductors; Supplier Part Number 1: C275333; Tolerance: ±5%; Rated Current: 100mA; DC Resistance: 1.6Ω; RoHS: Yes; ComponentLink1Description: Datasheet; ComponentLink1URL: https://wmsc.lcsc.com/wmsc/upload/file/pdf/v2/lcsc/2304140030_TDK-MLK1005SR10JT000_C275333.pdf; ComponentLink2Description: JLCPCB Part URL; ComponentLink2URL: https://jlcpcb.com/partdetail/C275333; ComponentLink3Description: LCSC Part URL; ComponentLink3URL: https://lcsc.com/product-detail/Inductors-SMD_TDK-TDK-MLK1005SR10JT000_C275333.html
footprint IND-0402 (0402 (1005M) Inductor)
pins: 1, 2

## MLK1005SR10JTD25
designator L?  Inductance: 100nH
Inductor, 100nH, ±5%, 1.6Ω, 100mA, SMD 0402; Manufacturer: TDK; Manufacturer Part Number: MLK1005SR10JTD25; Self-Resonant Frequency: 1.9GHz; Q Factor: 6@100MHz; Package Size: 0402; JLCPCB Basic Part: No; JLCPCB Part Number: C524462; Supplier 1: LCSC; Category: Inductors; Supplier Part Number 1: C524462; Tolerance: ±5%; Rated Current: 100mA; DC Resistance: 1.6Ω; RoHS: Yes; ComponentLink1Description: Datasheet; ComponentLink1URL: https://wmsc.lcsc.com/wmsc/upload/file/pdf/v2/lcsc/2006181232_TDK-MLK1005SR10JTD25_C524462.pdf; ComponentLink2Description: JLCPCB Part URL; ComponentLink2URL: https://jlcpcb.com/partdetail/C524462; ComponentLink3Description: LCSC Part URL; ComponentLink3URL: https://lcsc.com/product-detail/Inductors-SMD_TDK-TDK-MLK1005SR10JTD25_C524462.html
footprint IND-0402 (0402 (1005M) Inductor)
pins: 1, 2

## MLK1005SR12JT000
designator L?  Inductance: 120nH
Inductor, 120nH, ±5%, 2.08Ω, 100mA, SMD 0402; Manufacturer: TDK; Manufacturer Part Number: MLK1005SR12JT000; Self-Resonant Frequency: 1.9GHz; Q Factor: 6@100MHz; Package Size: 0402; JLCPCB Basic Part: No; JLCPCB Part Number: C275334; Supplier 1: LCSC; Category: Inductors; Supplier Part Number 1: C275334; Tolerance: ±5%; Rated Current: 100mA; DC Resistance: 2.08Ω; RoHS: Yes; ComponentLink1Description: Datasheet; ComponentLink1URL: https://wmsc.lcsc.com/wmsc/upload/file/pdf/v2/lcsc/2304140030_TDK-MLK1005SR12JT000_C275334.pdf; ComponentLink2Description: JLCPCB Part URL; ComponentLink2URL: https://jlcpcb.com/partdetail/C275334; ComponentLink3Description: LCSC Part URL; ComponentLink3URL: https://lcsc.com/product-detail/Inductors-SMD_TDK-TDK-MLK1005SR12JT000_C275334.html
footprint IND-0402 (0402 (1005M) Inductor)
pins: 1, 2

## MLK1005SR15JT000
designator L?  Inductance: 150nH
Inductor, 150nH, ±5%, 3.58Ω, 80mA, SMD 0402; Manufacturer: TDK; Manufacturer Part Number: MLK1005SR15JT000; Self-Resonant Frequency: 1.7GHz; Q Factor: 6@100MHz; Package Size: 0402; JLCPCB Basic Part: No; JLCPCB Part Number: C275335; Supplier 1: LCSC; Category: Inductors; Supplier Part Number 1: C275335; Tolerance: ±5%; Rated Current: 80mA; DC Resistance: 3.58Ω; RoHS: Yes; ComponentLink1Description: Datasheet; ComponentLink1URL: https://wmsc.lcsc.com/wmsc/upload/file/pdf/v2/lcsc/2304140030_TDK-MLK1005SR15JT000_C275335.pdf; ComponentLink2Description: JLCPCB Part URL; ComponentLink2URL: https://jlcpcb.com/partdetail/C275335; ComponentLink3Description: LCSC Part URL; ComponentLink3URL: https://lcsc.com/product-detail/Inductors-SMD_TDK-TDK-MLK1005SR15JT000_C275335.html
footprint IND-0402 (0402 (1005M) Inductor)
pins: 1, 2

## MLK1005SR22JT000
designator L?  Inductance: 220nH
Inductor, 220nH, ±5%, 4.54Ω, 70mA, SMD 0402; Manufacturer: TDK; Manufacturer Part Number: MLK1005SR22JT000; Self-Resonant Frequency: 1GHz; Q Factor: 6@100MHz; Package Size: 0402; JLCPCB Basic Part: No; JLCPCB Part Number: C275336; Supplier 1: LCSC; Category: Inductors; Supplier Part Number 1: C275336; Tolerance: ±5%; Rated Current: 70mA; DC Resistance: 4.54Ω; RoHS: Yes; ComponentLink1Description: Datasheet; ComponentLink1URL: https://wmsc.lcsc.com/wmsc/upload/file/pdf/v2/lcsc/2304140030_TDK-MLK1005SR22JT000_C275336.pdf; ComponentLink2Description: JLCPCB Part URL; ComponentLink2URL: https://jlcpcb.com/partdetail/C275336; ComponentLink3Description: LCSC Part URL; ComponentLink3URL: https://lcsc.com/product-detail/Inductors-SMD_TDK-TDK-MLK1005SR22JT000_C275336.html
footprint IND-0402 (0402 (1005M) Inductor)
pins: 1, 2

## MLK1005SR24JT000
designator L?  Inductance: 240nH
Inductor, 240nH, ±5%, 4.84Ω, 70mA, SMD 0402; Manufacturer: TDK; Manufacturer Part Number: MLK1005SR24JT000; Self-Resonant Frequency: 1GHz; Q Factor: 6@100MHz; Package Size: 0402; JLCPCB Basic Part: No; JLCPCB Part Number: C275337; Supplier 1: LCSC; Category: Inductors; Supplier Part Number 1: C275337; Tolerance: ±5%; Rated Current: 70mA; DC Resistance: 4.84Ω; RoHS: Yes; ComponentLink1Description: Datasheet; ComponentLink1URL: https://wmsc.lcsc.com/wmsc/upload/file/pdf/v2/lcsc/2304140030_TDK-MLK1005SR24JT000_C275337.pdf; ComponentLink2Description: JLCPCB Part URL; ComponentLink2URL: https://jlcpcb.com/partdetail/C275337; ComponentLink3Description: LCSC Part URL; ComponentLink3URL: https://lcsc.com/product-detail/Inductors-SMD_TDK-TDK-MLK1005SR24JT000_C275337.html
footprint IND-0402 (0402 (1005M) Inductor)
pins: 1, 2

## MLK1005SR33JT000
designator L?  Inductance: 330nH
Inductor, 330nH, ±5%, 5.82Ω, 70mA, SMD 0402; Manufacturer: TDK; Manufacturer Part Number: MLK1005SR33JT000; Self-Resonant Frequency: 850MHz; Q Factor: 6@100MHz; Package Size: 0402; JLCPCB Basic Part: No; JLCPCB Part Number: C2683176; Supplier 1: LCSC; Category: Inductors; Supplier Part Number 1: C2683176; Tolerance: ±5%; Rated Current: 70mA; DC Resistance: 5.82Ω; RoHS: Yes; ComponentLink1Description: Datasheet; ComponentLink1URL: https://wmsc.lcsc.com/wmsc/upload/file/pdf/v2/lcsc/2106070404_TDK-MLK1005SR33JT000_C2683176.pdf; ComponentLink2Description: JLCPCB Part URL; ComponentLink2URL: https://jlcpcb.com/partdetail/C2683176; ComponentLink3Description: LCSC Part URL; ComponentLink3URL: https://lcsc.com/product-detail/Inductors-SMD_TDK-TDK-MLK1005SR33JT000_C2683176.html
footprint IND-0402 (0402 (1005M) Inductor)
pins: 1, 2

## MLZ1005M1R0WT000
designator L?  Inductance: 1uH
Inductor, 1uH, ±20%, 350mΩ, 450mA, SMD 0402; Manufacturer: TDK; Manufacturer Part Number: MLZ1005M1R0WT000; Saturation Current: 100mA; Self-Resonant Frequency: 2MHz; Package Size: 0402; JLCPCB Basic Part: No; JLCPCB Part Number: C531288; Supplier 1: LCSC; Category: Inductors; Supplier Part Number 1: C531288; Tolerance: ±20%; Rated Current: 450mA; DC Resistance: 350mΩ; RoHS: Yes; ComponentLink1Description: Datasheet; ComponentLink1URL: https://wmsc.lcsc.com/wmsc/upload/file/pdf/v2/lcsc/2006191007_TDK-MLZ1005M1R0WT000_C531288.pdf; ComponentLink2Description: JLCPCB Part URL; ComponentLink2URL: https://jlcpcb.com/partdetail/C531288; ComponentLink3Description: LCSC Part URL; ComponentLink3URL: https://lcsc.com/product-detail/Inductors-SMD_TDK-TDK-MLZ1005M1R0WT000_C531288.html
footprint IND-0402 (0402 (1005M) Inductor)
pins: 1, 2

## MLZ1005M2R2WT000
designator L?  Inductance: 2.2uH
Inductor, 2.2uH, ±20%, 550mΩ, 350mA, SMD 0402; Manufacturer: TDK; Manufacturer Part Number: MLZ1005M2R2WT000; Saturation Current: 60mA; Package Size: 0402; JLCPCB Basic Part: No; JLCPCB Part Number: C383389; Supplier 1: LCSC; Category: Inductors; Supplier Part Number 1: C383389; Tolerance: ±20%; Rated Current: 350mA; DC Resistance: 550mΩ; RoHS: Yes; ComponentLink1Description: Datasheet; ComponentLink1URL: https://wmsc.lcsc.com/wmsc/upload/file/pdf/v2/lcsc/2304140030_TDK-MLZ1005M2R2WT000_C383389.pdf; ComponentLink2Description: JLCPCB Part URL; ComponentLink2URL: https://jlcpcb.com/partdetail/C383389; ComponentLink3Description: LCSC Part URL; ComponentLink3URL: https://lcsc.com/product-detail/Inductors-SMD_TDK-TDK-MLZ1005M2R2WT000_C383389.html
footprint IND-0402 (0402 (1005M) Inductor)
pins: 1, 2

## MLZ1005MR68WT000
designator L?  Inductance: 680nH
Inductor, 680nH, ±20%, 300mΩ, 450mA, SMD 0402; Manufacturer: TDK; Manufacturer Part Number: MLZ1005MR68WT000; Saturation Current: 110mA; Package Size: 0402; JLCPCB Basic Part: No; JLCPCB Part Number: C307747; Supplier 1: LCSC; Category: Inductors; Supplier Part Number 1: C307747; Tolerance: ±20%; Rated Current: 450mA; DC Resistance: 300mΩ; RoHS: Yes; ComponentLink1Description: Datasheet; ComponentLink1URL: https://wmsc.lcsc.com/wmsc/upload/file/pdf/v2/lcsc/1811121115_TDK-MLZ1005MR68WT000_C307747.pdf; ComponentLink2Description: JLCPCB Part URL; ComponentLink2URL: https://jlcpcb.com/partdetail/C307747; ComponentLink3Description: LCSC Part URL; ComponentLink3URL: https://lcsc.com/product-detail/Inductors-SMD_TDK-TDK-MLZ1005MR68WT000_C307747.html
footprint IND-0402 (0402 (1005M) Inductor)
pins: 1, 2

## MWSD1005C1N0ST
designator L?  Inductance: 1nH
Inductor, 1nH, 85mΩ, 650mA, SMD 0402; Manufacturer: Sunlord; Manufacturer Part Number: MWSD1005C1N0ST; Package Size: 0402; JLCPCB Basic Part: No; JLCPCB Part Number: C778756; Supplier 1: LCSC; Category: Inductors; Supplier Part Number 1: C778756; Rated Current: 650mA; DC Resistance: 85mΩ; RoHS: Yes; ComponentLink1Description: Datasheet; ComponentLink1URL: https://wmsc.lcsc.com/wmsc/upload/file/pdf/v2/lcsc/2310251550_Sunlord-MWSD1005C1N0ST_C778756.pdf; ComponentLink2Description: JLCPCB Part URL; ComponentLink2URL: https://jlcpcb.com/partdetail/C778756; ComponentLink3Description: LCSC Part URL; ComponentLink3URL: https://lcsc.com/product-detail/Power-Inductors_Sunlord-Sunlord-MWSD1005C1N0ST_C778756.html
footprint IND-0402 (0402 (1005M) Inductor)
pins: 1, 2

## MWSD1005C1N5STM01
designator L?  Inductance: 1.5nH
Inductor, 1.5nH, 30mΩ, 1A, SMD 0402; Manufacturer: Sunlord; Manufacturer Part Number: MWSD1005C1N5STM01; Self-Resonant Frequency: 6GHz; Q Factor: 10@250MHz; Package Size: 0402; JLCPCB Basic Part: No; JLCPCB Part Number: C778759; Supplier 1: LCSC; Category: Inductors; Supplier Part Number 1: C778759; Rated Current: 1A; DC Resistance: 30mΩ; RoHS: Yes; ComponentLink1Description: Datasheet; ComponentLink1URL: https://wmsc.lcsc.com/wmsc/upload/file/pdf/v2/lcsc/2110081730_Sunlord-MWSD1005C1N5STM01_C778759.pdf; ComponentLink2Description: JLCPCB Part URL; ComponentLink2URL: https://jlcpcb.com/partdetail/C778759; ComponentLink3Description: LCSC Part URL; ComponentLink3URL: https://lcsc.com/product-detail/Inductors-SMD_Sunlord-Sunlord-MWSD1005C1N5STM01_C778759.html
footprint IND-0402 (0402 (1005M) Inductor)
pins: 1, 2

## MWSD1005C1N6STM01
designator L?  Inductance: 1.6nH
Inductor, 1.6nH, 70mΩ, 750mA, SMD 0402; Manufacturer: Sunlord; Manufacturer Part Number: MWSD1005C1N6STM01; Package Size: 0402; JLCPCB Basic Part: No; JLCPCB Part Number: C778760; Supplier 1: LCSC; Category: Inductors; Supplier Part Number 1: C778760; Rated Current: 750mA; DC Resistance: 70mΩ; RoHS: Yes; ComponentLink1Description: Datasheet; ComponentLink1URL: https://wmsc.lcsc.com/wmsc/upload/file/pdf/v2/lcsc/2110081730_Sunlord-MWSD1005C1N6STM01_C778760.pdf; ComponentLink2Description: JLCPCB Part URL; ComponentLink2URL: https://jlcpcb.com/partdetail/C778760; ComponentLink3Description: LCSC Part URL; ComponentLink3URL: https://lcsc.com/product-detail/Inductors-SMD_Sunlord-Sunlord-MWSD1005C1N6STM01_C778760.html
footprint IND-0402 (0402 (1005M) Inductor)
pins: 1, 2

## MWSD1005C1N8STM01
designator L?  Inductance: 1.8nH
Inductor, 1.8nH, 160mΩ, 460mA, SMD 0402; Manufacturer: Sunlord; Manufacturer Part Number: MWSD1005C1N8STM01; Package Size: 0402; JLCPCB Basic Part: No; JLCPCB Part Number: C778762; Supplier 1: LCSC; Category: Inductors; Supplier Part Number 1: C778762; Rated Current: 460mA; DC Resistance: 160mΩ; RoHS: Yes; ComponentLink1Description: Datasheet; ComponentLink1URL: https://wmsc.lcsc.com/wmsc/upload/file/pdf/v2/lcsc/2110081730_Sunlord-MWSD1005C1N8STM01_C778762.pdf; ComponentLink2Description: JLCPCB Part URL; ComponentLink2URL: https://jlcpcb.com/partdetail/C778762; ComponentLink3Description: LCSC Part URL; ComponentLink3URL: https://lcsc.com/product-detail/Inductors-SMD_Sunlord-Sunlord-MWSD1005C1N8STM01_C778762.html
footprint IND-0402 (0402 (1005M) Inductor)
pins: 1, 2